# Altium footprint library ST封装.PcbLib: 1336 footprints (part 52 of 109)
Each footprint in its own frame and in the unit in brackets; x right, y up, seen from the top. Pads: shape width x height; smd on the part's side, far side on the other; paste and mask are expansions set on the pad; w line width, h text height; cw(c..) or ccw(c..) is an arc to the next point about the centre after c.
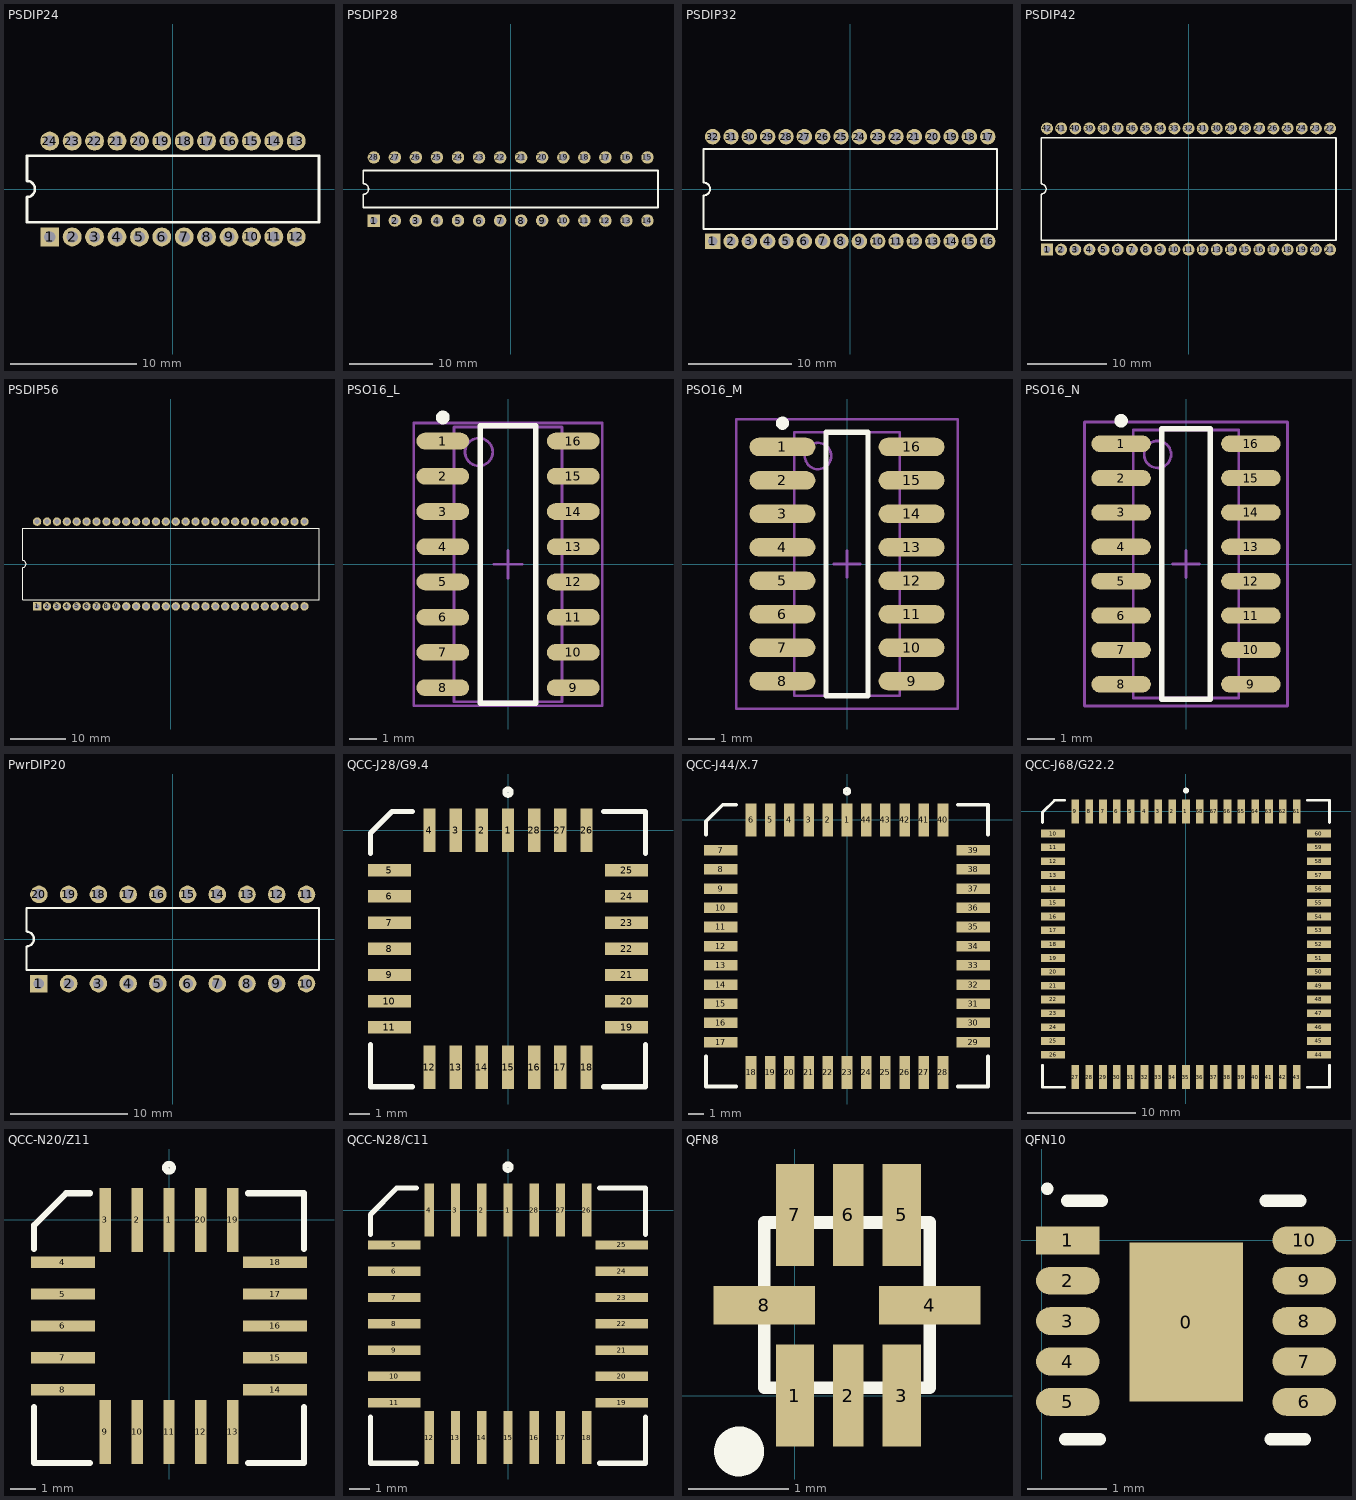
[diagram p51: the footprints below, top view; thin cyan lines are the x and y axes]

## PSDIP24 [mm] "DIP; 24 Leads; Row Spacing 7.62 mm; Pitch 1.778 mm"
height 5.08
pads (24):
  rect 1.5x1.5 hole 0.9: 1(-9.79,-3.81)
  round 1.5 hole 0.9: 2(-8.01,-3.81) 3(-6.23,-3.81) 4(-4.45,-3.81) 5(-2.67,-3.81) 6(-0.89,-3.81) 7(0.89,-3.81) 8(2.67,-3.81) 9(4.45,-3.81) 10(6.23,-3.81) 11(8.01,-3.81) 12(9.79,-3.81) 13(9.79,3.81) 14(8.01,3.81) 15(6.23,3.81) 16(4.45,3.81) 17(2.67,3.81) 18(0.89,3.81) 19(-0.89,3.81) 20(-2.67,3.81) 21(-4.45,3.81) 22(-6.23,3.81) 23(-8.01,3.81) 24(-9.79,3.81)
Top Overlay:
  lines w0.2: -11.6,-2.65 11.6,-2.65 11.6,2.65 -11.6,2.65 -11.6,0.635 cw(c-11.6,0) -11.6,-0.635 -11.6,-2.65

## PSDIP28 [mm] "DIP, Plastic Skinny; 28 Leads; Row Spacing 7.62 mm; Pitch 2.54 mm"
height 4.57
pads (28):
  rect 1.5x1.5 hole 0.9: 1(-16.51,-3.81)
  round 1.5 hole 0.9: 2(-13.97,-3.81) 3(-11.43,-3.81) 4(-8.89,-3.81) 5(-6.35,-3.81) 6(-3.81,-3.81) 7(-1.27,-3.81) 8(1.27,-3.81) 9(3.81,-3.81) 10(6.35,-3.81) 11(8.89,-3.81) 12(11.43,-3.81) 13(13.97,-3.81) 14(16.51,-3.81) 15(16.51,3.81) 16(13.97,3.81) 17(11.43,3.81) 18(8.89,3.81) 19(6.35,3.81) 20(3.81,3.81) 21(1.27,3.81) 22(-1.27,3.81) 23(-3.81,3.81) 24(-6.35,3.81) 25(-8.89,3.81) 26(-11.43,3.81) 27(-13.97,3.81) 28(-16.51,3.81)
Top Overlay:
  lines w0.2: -17.78,-2.225 -17.78,-0.635 ccw(c-17.78,0) -17.78,0.635 -17.78,2.225 17.78,2.225 17.78,-2.225 -17.78,-2.225

## PSDIP32 [mm] "DIP, Plastic Shrink; 32 Leads; Row Spacing 10.16 mm; Pitch 1.78 mm"
height 5.08
pads (32):
  rect 1.5x1.5 hole 0.9: 1(-13.35,-5.08)
  round 1.5 hole 0.9: 2(-11.57,-5.08) 3(-9.79,-5.08) 4(-8.01,-5.08) 5(-6.23,-5.08) 6(-4.45,-5.08) 7(-2.67,-5.08) 8(-0.89,-5.08) 9(0.89,-5.08) 10(2.67,-5.08) 11(4.45,-5.08) 12(6.23,-5.08) 13(8.01,-5.08) 14(9.79,-5.08) 15(11.57,-5.08) 16(13.35,-5.08) 17(13.35,5.08) 18(11.57,5.08) 19(9.79,5.08) 20(8.01,5.08) 21(6.23,5.08) 22(4.45,5.08) 23(2.67,5.08) 24(0.89,5.08) 25(-0.89,5.08) 26(-2.67,5.08) 27(-4.45,5.08) 28(-6.23,5.08) 29(-8.01,5.08) 30(-9.79,5.08) 31(-11.57,5.08) 32(-13.35,5.08)
Top Overlay:
  lines w0.2: -14.25,-0.635 -14.25,-3.9 14.25,-3.9 14.25,3.9 -14.25,3.9 -14.25,0.635 ; -14.24,-0.635 ccw(c-14.24,0) -14.24,0.635

## PSDIP42 [mm] "DIP, Plastic Shrink; 42 Leads; Row Spacing 15.24 mm; Pitch 1.78 mm"
height 5.08
pads (42):
  rect 1.5x1.5 hole 0.9: 1(-17.8,-7.62)
  round 1.5 hole 0.9: 2(-16.02,-7.62) 3(-14.24,-7.62) 4(-12.46,-7.62) 5(-10.68,-7.62) 6(-8.9,-7.62) 7(-7.12,-7.62) 8(-5.34,-7.62) 9(-3.56,-7.62) 10(-1.78,-7.62) 11(0,-7.62) 12(1.78,-7.62) 13(3.56,-7.62) 14(5.34,-7.62) 15(7.12,-7.62) 16(8.9,-7.62) 17(10.68,-7.62) 18(12.46,-7.62) 19(14.24,-7.62) 20(16.02,-7.62) 21(17.8,-7.62) 22(17.8,7.62) 23(16.02,7.62) 24(14.24,7.62) 25(12.46,7.62) 26(10.68,7.62) 27(8.9,7.62) 28(7.12,7.62) 29(5.34,7.62) 30(3.56,7.62) 31(1.78,7.62) 32(0,7.62) 33(-1.78,7.62) 34(-3.56,7.62) 35(-5.34,7.62) 36(-7.12,7.62) 37(-8.9,7.62) 38(-10.68,7.62) 39(-12.46,7.62) 40(-14.24,7.62) 41(-16.02,7.62) 42(-17.8,7.62)
Top Overlay:
  lines w0.2: -18.55,-6.45 -18.55,-0.635 ccw(c-18.55,0) -18.55,0.635 -18.55,6.45 18.55,6.45 18.55,-6.45 -18.55,-6.45

## PSDIP56 [mm] "DIP, Plastic Shrink; 56 Leads; Row Spacing 15.24 mm; Pitch 1.78 mm"
height 6.35
pads (56):
  rect 1.5x1.5 hole 0.9: 1(-24.03,-7.62)
  round 1.5 hole 0.9: 2(-22.25,-7.62) 3(-20.47,-7.62) 4(-18.69,-7.62) 5(-16.91,-7.62) 6(-15.13,-7.62) 7(-13.35,-7.62) 8(-11.57,-7.62) 9(-9.79,-7.62) 10(-8.01,-7.62) 11(-6.23,-7.62) 12(-4.45,-7.62) 13(-2.67,-7.62) 14(-0.89,-7.62) 15(0.89,-7.62) 16(2.67,-7.62) 17(4.45,-7.62) 18(6.23,-7.62) 19(8.01,-7.62) 20(9.79,-7.62) 21(11.57,-7.62) 22(13.35,-7.62) 23(15.13,-7.62) 24(16.91,-7.62) 25(18.69,-7.62) 26(20.47,-7.62) 27(22.25,-7.62) 28(24.03,-7.62) 29(24.03,7.62) 30(22.25,7.62) 31(20.47,7.62) 32(18.69,7.62) 33(16.91,7.62) 34(15.13,7.62) 35(13.35,7.62) 36(11.57,7.62) 37(9.79,7.62) 38(8.01,7.62) 39(6.23,7.62) 40(4.45,7.62) 41(2.67,7.62) 42(0.89,7.62) 43(-0.89,7.62) 44(-2.67,7.62) 45(-4.45,7.62) 46(-6.23,7.62) 47(-8.01,7.62) 48(-9.79,7.62) 49(-11.57,7.62) 50(-13.35,7.62) 51(-15.13,7.62) 52(-16.91,7.62) 53(-18.69,7.62) 54(-20.47,7.62) 55(-22.25,7.62) 56(-24.03,7.62)
Top Overlay:
  lines w0.2: -26.65,-6.45 -26.65,-0.635 ccw(c-26.65,0) -26.65,0.635 -26.65,6.45 26.65,6.45 26.65,-6.45 -26.65,-6.45

## PSO16_L [mm] "16-Pin Plastic Small Outline Integrated Circuit 1.27 mm Pitch, IPC High Density"
height 1.75
pads (16):
  oval 1.9x0.6 smd: 1(-2.35,4.445) 2(-2.35,3.175) 3(-2.35,1.905) 4(-2.35,0.635) 5(-2.35,-0.635) 6(-2.35,-1.905) 7(-2.35,-3.175) 8(-2.35,-4.445) 9(2.35,-4.445) 10(2.35,-3.175) 11(2.35,-1.905) 12(2.35,-0.635) 13(2.35,0.635) 14(2.35,1.905) 15(2.35,3.175) 16(2.35,4.445)
Top Overlay:
  circle w0.25: c-2.35,5.295 r0.125
  lines w0.2: -1,-5 1,-5 1,5 -1,5 -1,-5
Mechanical 13:
  circle w0.1: c-1.05,4.05 r0.5
  lines w0.1: -1.95,-4.95 1.95,-4.95 1.95,4.95 -1.95,4.95 -1.95,-4.95
Mechanical 15:
  lines w0.1: -0.5,0 0.5,0 ; 0,-0.5 0,0.5 ; -3.4,-5.1 3.4,-5.1 3.4,5.1 -3.4,5.1 -3.4,-5.1
3D body: height 1.75, standoff 0, extent -1.95,-4.95 1.95,4.95

## PSO16_M [mm] "16-Pin Plastic Small Outline Integrated Circuit 1.27 mm Pitch, IPC Low Density"
height 1.75
pads (16):
  oval 2.5x0.7 smd: 1(-2.45,4.445) 2(-2.45,3.175) 3(-2.45,1.905) 4(-2.45,0.635) 5(-2.45,-0.635) 6(-2.45,-1.905) 7(-2.45,-3.175) 8(-2.45,-4.445) 9(2.45,-4.445) 10(2.45,-3.175) 11(2.45,-1.905) 12(2.45,-0.635) 13(2.45,0.635) 14(2.45,1.905) 15(2.45,3.175) 16(2.45,4.445)
Top Overlay:
  circle w0.25: c-2.45,5.345 r0.125
  lines w0.2: -0.8,-5 0.8,-5 0.8,5 -0.8,5 -0.8,-5
Mechanical 13:
  circle w0.1: c-1.1,4.1 r0.5
  lines w0.1: -2,-5 2,-5 2,5 -2,5 -2,-5
Mechanical 15:
  lines w0.1: -0.5,0 0.5,0 ; 0,-0.5 0,0.5 ; -4.2,-5.5 4.2,-5.5 4.2,5.5 -4.2,5.5 -4.2,-5.5
3D body: height 1.75, standoff 0, extent -2,-5 2,5

## PSO16_N [mm] "16-Pin Plastic Small Outline Integrated Circuit 1.27 mm Pitch, IPC Medium Density"
height 1.75
pads (16):
  oval 2.2x0.6 smd: 1(-2.4,4.445) 2(-2.4,3.175) 3(-2.4,1.905) 4(-2.4,0.635) 5(-2.4,-0.635) 6(-2.4,-1.905) 7(-2.4,-3.175) 8(-2.4,-4.445) 9(2.4,-4.445) 10(2.4,-3.175) 11(2.4,-1.905) 12(2.4,-0.635) 13(2.4,0.635) 14(2.4,1.905) 15(2.4,3.175) 16(2.4,4.445)
Top Overlay:
  circle w0.25: c-2.4,5.295 r0.125
  lines w0.2: -0.9,-5 -0.9,5 0.9,5 0.9,-5 -0.9,-5
Mechanical 13:
  circle w0.1: c-1.05,4.05 r0.5
  lines w0.1: -1.95,-4.95 -1.95,4.95 1.95,4.95 1.95,-4.95 -1.95,-4.95
Mechanical 15:
  lines w0.1: -0.5,0 0.5,0 ; 0,-0.5 0,0.5 ; -3.75,-5.25 -3.75,5.25 3.75,5.25 3.75,-5.25 -3.75,-5.25
3D body: height 1.75, standoff 0, extent -1.95,-4.95 1.95,4.95

## PwrDIP20 [mm] "DIP; 20 Leads; Row Spacing 7.62 mm; Pitch 2.54 mm"
height 5.1
pads (20):
  rect 1.5x1.5 hole 0.9: 1(-11.43,-3.81)
  round 1.5 hole 0.9: 2(-8.89,-3.81) 3(-6.35,-3.81) 4(-3.81,-3.81) 5(-1.27,-3.81) 6(1.27,-3.81) 7(3.81,-3.81) 8(6.35,-3.81) 9(8.89,-3.81) 10(11.43,-3.81) 11(11.43,3.81) 12(8.89,3.81) 13(6.35,3.81) 14(3.81,3.81) 15(1.27,3.81) 16(-1.27,3.81) 17(-3.81,3.81) 18(-6.35,3.81) 19(-8.89,3.81) 20(-11.43,3.81)
Top Overlay:
  lines w0.2: -12.5,-2.65 -12.5,-0.635 ccw(c-12.5,0) -12.5,0.635 -12.5,2.65 12.5,2.65 12.5,-2.65 -12.5,-2.65

## QCC-J28/G9.4 [mm]
pads (28):
  rect 0.6x2.1 smd: 1(0,0) 2(-1.27,0) 3(-2.54,0) 4(-3.81,0) 12(-3.81,-11.5) 13(-2.54,-11.5) 14(-1.27,-11.5) 15(0,-11.5) 16(1.27,-11.5) 17(2.54,-11.5) 18(3.81,-11.5) 26(3.81,0) 27(2.54,0) 28(1.27,0)
  rect 2.1x0.6 smd: 5(-5.75,-1.94) 6(-5.75,-3.21) 7(-5.75,-4.48) 8(-5.75,-5.75) 9(-5.75,-7.02) 10(-5.75,-8.29) 11(-5.75,-9.56) 19(5.75,-9.56) 20(5.75,-8.29) 21(5.75,-7.02) 22(5.75,-5.75) 23(5.75,-4.48) 24(5.75,-3.21) 25(5.75,-1.94)
Top Overlay:
  circle w0.25: c0,1.85 r0.15
  lines w0.25: -6.675,-10.407 -6.675,-12.437 -4.645,-12.437 ; -6.675,-1.117 -6.675,-0.137 -5.625,0.912 -4.645,0.912 ; 4.645,-12.437 6.675,-12.437 6.675,-10.407 ; 4.645,0.912 6.675,0.912 6.675,-1.117

## QCC-J44/X.7 [mm]
pads (44):
  rect 0.7x2.2 smd: 1(0,0) 2(-1.27,0) 3(-2.54,0) 4(-3.81,0) 5(-5.08,0) 6(-6.35,0) 18(-6.35,-16.7) 19(-5.08,-16.7) 20(-3.81,-16.7) 21(-2.54,-16.7) 22(-1.27,-16.7) 23(0,-16.7) 24(1.27,-16.7) 25(2.54,-16.7) 26(3.81,-16.7) 27(5.08,-16.7) 28(6.35,-16.7) 40(6.35,0) 41(5.08,0) 42(3.81,0) 43(2.54,0) 44(1.27,0)
  rect 2.2x0.7 smd: 7(-8.35,-2) 8(-8.35,-3.27) 9(-8.35,-4.54) 10(-8.35,-5.81) 11(-8.35,-7.08) 12(-8.35,-8.35) 13(-8.35,-9.62) 14(-8.35,-10.89) 15(-8.35,-12.16) 16(-8.35,-13.43) 17(-8.35,-14.7) 29(8.35,-14.7) 30(8.35,-13.43) 31(8.35,-12.16) 32(8.35,-10.89) 33(8.35,-9.62) 34(8.35,-8.35) 35(8.35,-7.08) 36(8.35,-5.81) 37(8.35,-4.54) 38(8.35,-3.27) 39(8.35,-2)
Top Overlay:
  circle w0.25: c0,1.9 r0.15
  lines w0.25: -9.325,-15.647 -9.325,-17.638 -7.335,-17.638 ; -9.325,-0.977 -9.325,-0.088 -8.225,1.012 -7.335,1.012 ; 7.335,-17.638 9.325,-17.638 9.325,-15.647 ; 7.335,1.012 9.325,1.012 9.325,-0.977

## QCC-J68/G22.2 [mm]
pads (68):
  rect 0.7x2.2 smd: 1(0,0) 2(-1.27,0) 3(-2.54,0) 4(-3.81,0) 5(-5.08,0) 6(-6.35,0) 7(-7.62,0) 8(-8.89,0) 9(-10.16,0) 27(-10.16,-24.4) 28(-8.89,-24.4) 29(-7.62,-24.4) 30(-6.35,-24.4) 31(-5.08,-24.4) 32(-3.81,-24.4) 33(-2.54,-24.4) 34(-1.27,-24.4) 35(0,-24.4) 36(1.27,-24.4) 37(2.54,-24.4) 38(3.81,-24.4) 39(5.08,-24.4) 40(6.35,-24.4) 41(7.62,-24.4) 42(8.89,-24.4) 43(10.16,-24.4) 61(10.16,0) 62(8.89,0) 63(7.62,0) 64(6.35,0) 65(5.08,0) 66(3.81,0) 67(2.54,0) 68(1.27,0)
  rect 2.2x0.7 smd: 10(-12.2,-2.04) 11(-12.2,-3.31) 12(-12.2,-4.58) 13(-12.2,-5.85) 14(-12.2,-7.12) 15(-12.2,-8.39) 16(-12.2,-9.66) 17(-12.2,-10.93) 18(-12.2,-12.2) 19(-12.2,-13.47) 20(-12.2,-14.74) 21(-12.2,-16.01) 22(-12.2,-17.28) 23(-12.2,-18.55) 24(-12.2,-19.82) 25(-12.2,-21.09) 26(-12.2,-22.36) 44(12.2,-22.36) 45(12.2,-21.09) 46(12.2,-19.82) 47(12.2,-18.55) 48(12.2,-17.28) 49(12.2,-16.01) 50(12.2,-14.74) 51(12.2,-13.47) 52(12.2,-12.2) 53(12.2,-10.93) 54(12.2,-9.66) 55(12.2,-8.39) 56(12.2,-7.12) 57(12.2,-5.85) 58(12.2,-4.58) 59(12.2,-3.31) 60(12.2,-2.04)
Top Overlay:
  circle w0.25: c0,1.9 r0.15
  lines w0.25: -13.175,-23.307 -13.175,-25.337 -11.145,-25.337 ; -13.175,-1.017 -13.175,-0.088 -12.075,1.012 -11.145,1.012 ; 11.145,-25.337 13.175,-25.337 13.175,-23.307 ; 11.145,1.012 13.175,1.012 13.175,-1.017

## QCC-N20/Z11 [mm]
pads (20):
  rect 0.45x2.55 smd: 1(0,0) 2(-1.27,0) 3(-2.54,0) 9(-2.54,-8.45) 10(-1.27,-8.45) 11(0,-8.45) 12(1.27,-8.45) 13(2.54,-8.45) 19(2.54,0) 20(1.27,0)
  rect 2.55x0.45 smd: 4(-4.225,-1.685) 5(-4.225,-2.955) 6(-4.225,-4.225) 7(-4.225,-5.495) 8(-4.225,-6.765) 14(4.225,-6.765) 15(4.225,-5.495) 16(4.225,-4.225) 17(4.225,-2.955) 18(4.225,-1.685)
Top Overlay:
  circle w0.25: c0,2.075 r0.15
  lines w0.25: -5.375,-7.462 -5.375,-9.688 -3.15,-9.688 ; -5.375,-1.163 -5.375,-0.212 -4.1,1.063 -3.15,1.063 ; 3.15,-9.688 5.375,-9.688 5.375,-7.462 ; 3.15,1.063 5.375,1.063 5.375,-1.163

## QCC-N28/C11 [mm]
pads (28):
  rect 0.45x2.55 smd: 1(0,0) 2(-1.27,0) 3(-2.54,0) 4(-3.81,0) 12(-3.81,-11) 13(-2.54,-11) 14(-1.27,-11) 15(0,-11) 16(1.27,-11) 17(2.54,-11) 18(3.81,-11) 26(3.81,0) 27(2.54,0) 28(1.27,0)
  rect 2.55x0.45 smd: 5(-5.5,-1.69) 6(-5.5,-2.96) 7(-5.5,-4.23) 8(-5.5,-5.5) 9(-5.5,-6.77) 10(-5.5,-8.04) 11(-5.5,-9.31) 19(5.5,-9.31) 20(5.5,-8.04) 21(5.5,-6.77) 22(5.5,-5.5) 23(5.5,-4.23) 24(5.5,-2.96) 25(5.5,-1.69)
Top Overlay:
  circle w0.25: c0,2.075 r0.15
  lines w0.25: -6.65,-10.007 -6.65,-12.237 -4.42,-12.237 ; -6.65,-1.168 -6.65,-0.212 -5.375,1.063 -4.42,1.063 ; 4.42,-12.237 6.65,-12.237 6.65,-10.007 ; 4.42,1.063 6.65,1.063 6.65,-1.168

## QFN8 [mil]
pads (8):
  rect 15x40 smd: 1(0,0) 3(42,0) 5(42,71) 7(0,71)
  rect 12x40 smd: 2(21,0) 6(21,71)
  rect 40x15 smd: 4(53,35.5) 8(-12,35.5)
Top Overlay:
  circle w9.84: c-21.92,-22 r4.92
  lines w5: -12,3 53,3 53,68 -12,68 -12,3

## QFN10 [mm]
pads (11):
  rect 1.425x2 smd: 0(1.817,-1.027)
  rect 0.8x0.35 smd: 1(0.329,0)
  oval 0.8x0.35 smd: 2(0.329,-0.508) 3(0.329,-1.016) 4(0.329,-1.524) 5(0.329,-2.032) 6(3.302,-2.032) 7(3.302,-1.524) 8(3.302,-1.016) 9(3.302,-0.508) 10(3.302,0)
Top Overlay:
  lines w0.152: 0.067,0.649 0.075,0.649 ; 0.292,-2.501 0.731,-2.501 ; 0.317,0.499 0.756,0.499 ; 2.817,0.499 3.256,0.499 ; 2.88,-2.501 3.312,-2.501
3D body "User Library-10m1 QFN50P300X300X100-10_270X175_IPC-7351B.step": height 1, standoff -0.05, extent 0.292,-2.501 3.312,0.499